# Altium footprint library Modules.PcbLib: 18 footprints (part 2 of 2)
Each footprint in its own frame and in the unit in brackets; x right, y up, seen from the top. Pads: shape width x height; smd on the part's side, far side on the other; paste and mask are expansions set on the pad; w line width, h text height; cw(c..) or ccw(c..) is an arc to the next point about the centre after c.
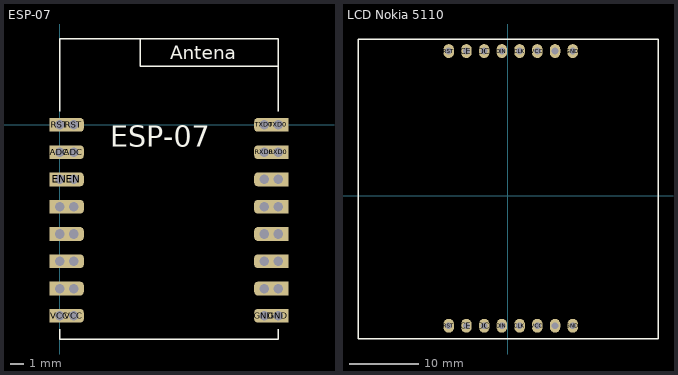
[diagram p1: the footprints below, top view; thin cyan lines are the x and y axes]

## ESP-07 [mm]
pads (32):
  rect 1.5x1 hole 0.7: ADC(0,-2) EN(0,-4) GND(16,-14) GPIO0(16,-8) GPIO2(16,-10) GPIO4(16,-6) GPIO5(16,-4) GPIO12(0,-10) GPIO13(0,-12) GPIO14(0,-8) GPIO15(16,-12) GPIO16(0,-6) RST(0,0) RXD0(16,-2) TXD0(16,0) VCC(0,-14)
  rrect50% 1.5x1 hole 0.7: ADC(1,-2) EN(1,-4) GND(15,-14) GPIO0(15,-8) GPIO2(15,-10) GPIO4(15,-6) GPIO5(15,-4) GPIO12(1,-10) GPIO13(1,-12) GPIO14(1,-8) GPIO15(15,-12) GPIO16(1,-6) RST(1,0) RXD0(15,-2) TXD0(15,0) VCC(1,-14)
Top Overlay:
  lines w0.1: 0,-15 0,-15.7 16,-15.7 16,-15 ; 0,1 0,6.3 16,6.3 16,1 ; 5.9,6.3 5.9,4.3 16,4.3
  text "ESP-07" at 3.7,-1.6 h1.52
  text "Antena" at 8.1,4.8 h1
3D body "ESP8266_ESP-07.step": height 3.5, standoff -0.01, extent 0.019,-15.687 16.019,6.313

## LCD Nokia 5110 [mm]
pads (16):
  oval 1.5x2 hole 1: CE(-5.96,-18.6) CE(-5.96,20.77) CLK(1.66,-18.6) CLK(1.66,20.77) DC(-3.42,-18.6) DC(-3.42,20.77) DIN(-0.88,-18.6) DIN(-0.88,20.77) GND(9.28,-18.6) GND(9.28,20.77) LIGHT(6.74,-18.6) LIGHT(6.74,20.77) RST(-8.5,-18.6) RST(-8.5,20.77) VCC(4.2,-18.6) VCC(4.2,20.77)
Top Overlay:
  lines w0.2: -21.5,-20.5 -21.5,22.5 21.5,22.5 21.5,-20.5 -21.5,-20.5
3D body: height 1.6, standoff 0, extent -21.5,-20.5 21.5,22.5
3D body: height 5.1, standoff 1.6, extent -20,-16.5 19,17.5
3D body: height 4.8, standoff 1.6, extent -19,-15.5 18,10.5